# Altium footprint library ZYF_Common.PcbLib: 64 footprints (part 4 of 4)
Each footprint in its own frame and in the unit in brackets; x right, y up, seen from the top. Pads: shape width x height; smd on the part's side, far side on the other; paste and mask are expansions set on the pad; w line width, h text height; cw(c..) or ccw(c..) is an arc to the next point about the centre after c.
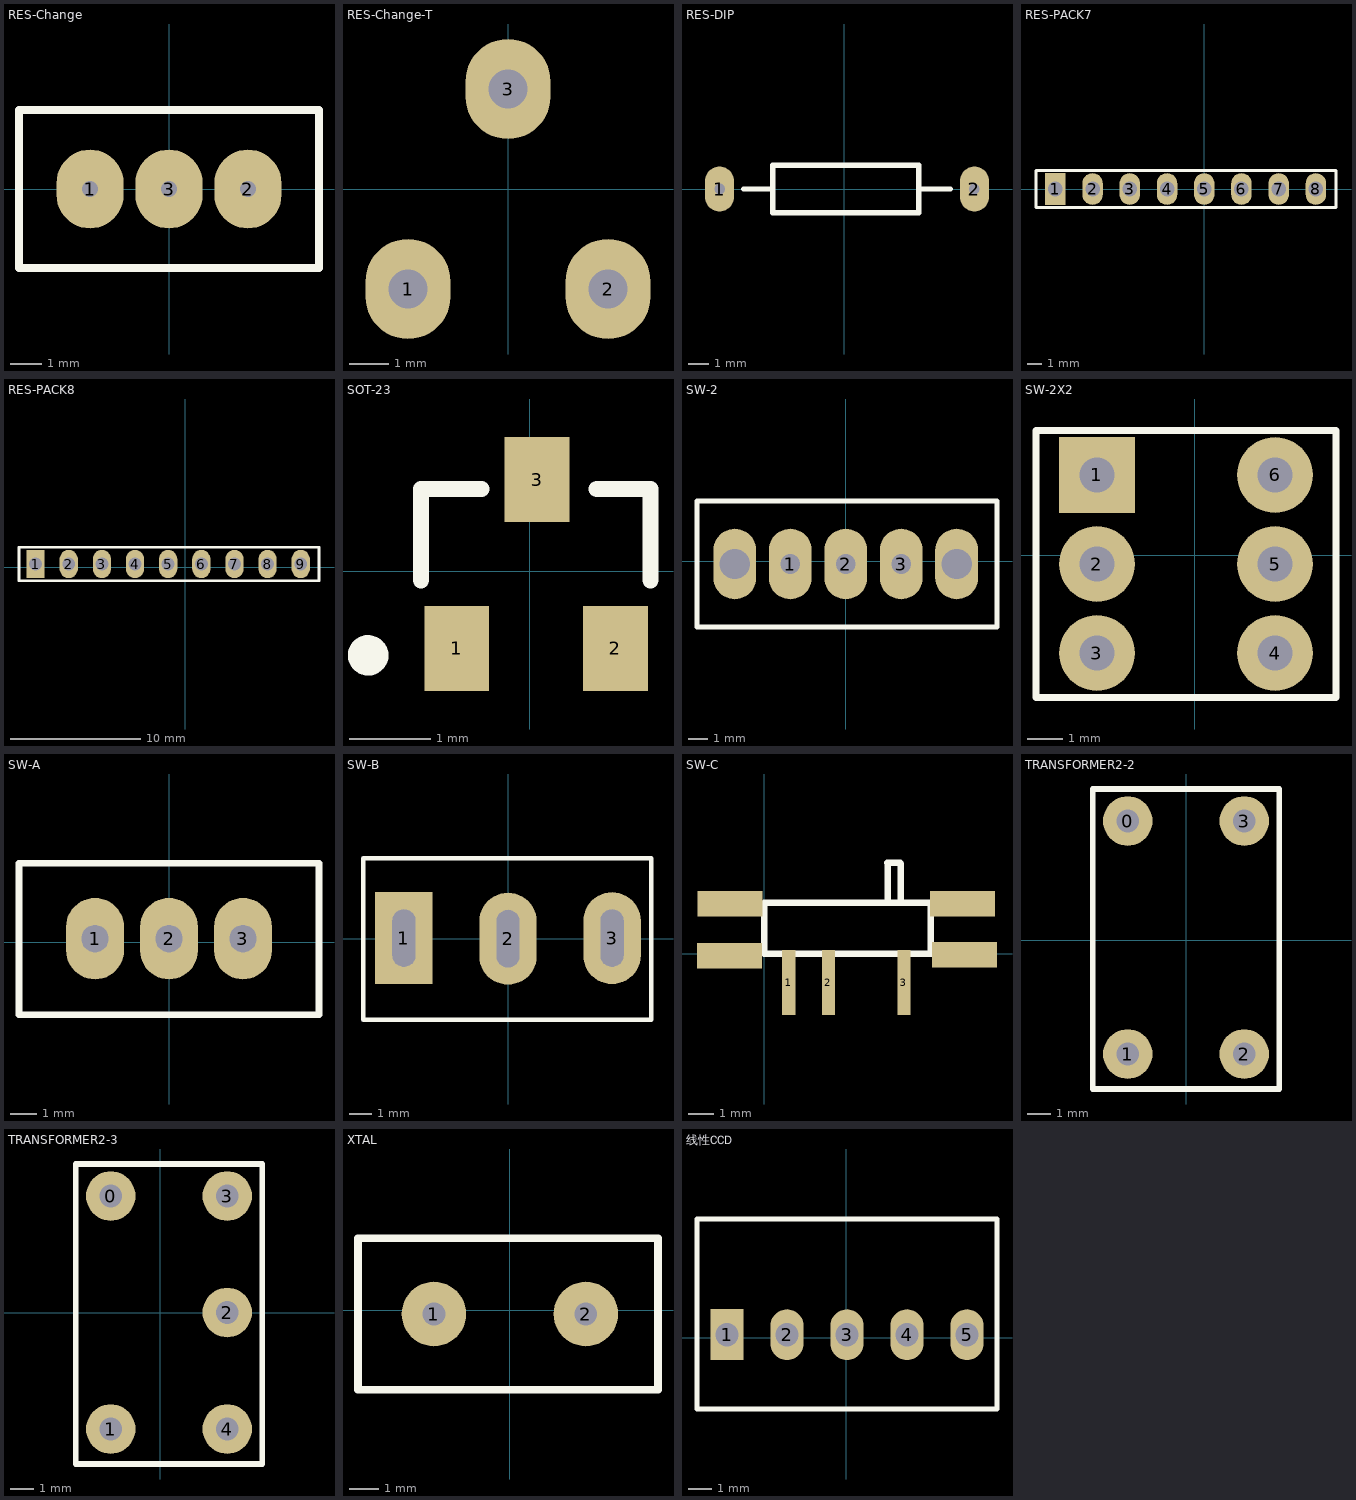
[diagram p3: the footprints below, top view; thin cyan lines are the x and y axes]

## RES-Change [mil]
pads (3):
  oval 85x100 hole 20: 1(-100,0) 2(100,0) 3(0,0)
Top Overlay:
  lines w10: -190,-100 -190,100 190,100 190,-100 -190,-100
3D body: height 454.72, standoff -62.99, extent -187.6,-94.49 187.6,94.49

## RES-Change-T [mil]
pads (3):
  oval 85x100 hole 39: 1(-100,-100) 2(100,-100) 3(0,100)
3D body: height 300, standoff -119.49, extent -134.05,-191.98 134.06,132.89

## RES-DIP [mil]
pads (2):
  oval 55x85 hole 20: 1(-235,0) 2(245,0)
Top Overlay:
  lines w10: -190,0 -135,0 ; 145,0 200,0 ; -135,-45 -135,45 140,45 140,-45 -135,-45

## RES-PACK7 [mil]
pads (8):
  rect 55x85 hole 39: 1(-400,0)
  oval 55x85 hole 39: 2(-300,0) 3(-200,0) 4(-100,0) 5(0,0) 6(100,0) 7(200,0) 8(300,0)
Top Overlay:
  lines w7.87: -452,-50 354,-50 354,50 -300,50 -352,50 -452,50 -452,-50
3D body: height 306.75, standoff -173.31, extent -449.02,-50 349.02,48.03

## RES-PACK8 [mil]
pads (9):
  rect 55x85 hole 39: 1(-451,10)
  oval 55x85 hole 39: 2(-351,10) 3(-251,10) 4(-151,10) 5(-51,10) 6(49,10) 7(149,10) 8(249,10) 9(349,10)
Top Overlay:
  lines w7.87: -501,-40 -501,60 -426,60 404,60 404,-40 -501,-40
3D body: height 181.89, standoff -150, extent -504.02,-38 394.02,60.43

## SOT-23 [mil]
pads (3):
  rect 31.5x41.34 smd: 1(-35.5,-37.5) 2(41.5,-37.5) 3(3.5,44.5)
Top Overlay:
  circle w9.84: c-78.49,-40.85 r4.92
  lines w7.87: -52.9,-4.44 -52.9,39.85 -23.5,39.85 ; 32.5,39.85 58.5,39.85 58.5,-4.44
3D body: height 43.31, standoff 0, extent -55.55,-45.5 62.56,54.57

## SW [mil]

## SW-2 [mil]
pads (5):
  oval 85x140 hole 39: 1(-110,-5) 2(0,-5) 3(110,-5)
  oval 85x140 hole 60: ""(-220,-5) ""(220,-5)
Top Overlay:
  lines w10: -295,-130 300,-130 300,120 -295,120 -295,-130

## SW-2X2 [mil]
pads (6):
  rect 85x85 hole 39: 1(-110,90)
  round 85 hole 39: 2(-110,-10) 3(-110,-110) 4(90,-110) 5(90,-10) 6(90,90)
Top Overlay:
  lines w7.87: -178.5,-160 158.5,-160 158.5,140 -178.5,140 -178.5,-160

## SW-A [mil]
pads (3):
  oval 85.42x120.17 hole 39.37 slot 40 at 90 deg: 1(-109,5)
  oval 85x120.17 hole 39.37 slot 40 at 90 deg: 2(0,5) 3(109,5)
Top Overlay:
  lines w10: -221,-107 221,-107 221,116 -221,116 -221,-107
3D body: height 383, standoff -170, extent -216.49,-105.99 216.51,114.01

## SW-B [mil]
pads (3):
  rect 100x160 hole 40 slot 100 at 90 deg: 1(-181,1)
  oval 100x160 hole 40 slot 100 at 90 deg: 2(0,0) 3(181,1)
Top Overlay:
  lines w7.87: -252,-141 -252,140 249,140 249,-141 -252,-141
3D body: height 1119.86, standoff -155.12, extent -250.53,-200.01 250,199.99

## SW-C [mil]
pads (7):
  rect 20x100 smd: 1(38,-44) 2(99,-44) 3(215,-44)
  rect 100x39 smd: ""(-53,-3) ""(-52,77) ""(305,77) ""(308,-1)
Top Overlay:
  lines w10: 190,78.74 190,139 189,140 209,140 210,139 210,82 ; 0,0 255.91,0 255.91,78.74 0,78.74 0,0

## TRANSFORMER2-2 [mil]
pads (4):
  round 85 hole 39: 0(-100,205) 1(-100,-195) 2(100,-195) 3(100,205)
Top Overlay:
  lines w10: -160,-255 160,-255 160,260 -160,260 -160,-255

## TRANSFORMER2-3 [mil]
pads (5):
  round 85 hole 39: 0(-85,200) 1(-85,-200) 2(115,0) 3(115,200) 4(115,-200)
Top Overlay:
  lines w10: -145,-260 175,-260 175,255 -145,255 -145,-260

## XTAL [mil]
pads (2):
  round 85 hole 30: 1(-100,-5) 2(100,-5)
Top Overlay:
  lines w10: -200,-105 -200,95 195,95 195,-105 -200,-105
3D body: height 141.73, standoff -118.11, extent -218.14,-93 214.14,83.81

## 线性CCD [mil]
pads (5):
  rect 55x85 hole 39: 1(-199,5)
  oval 55x85 hole 39: 2(-99,5) 3(1,5) 4(101,5) 5(201,5)
Top Overlay:
  lines w7.87: -249,-119 -249,198 251,198 251,-119 -249,-119
3D body: height 322.83, standoff -118.11, extent -245.05,-44.04 254.94,54.32